# Altium footprint library 总库.PcbLib: 264 footprints (part 7 of 17)
Each footprint in its own frame and in the unit in brackets; x right, y up, seen from the top. Pads: shape width x height; smd on the part's side, far side on the other; paste and mask are expansions set on the pad; w line width, h text height; cw(c..) or ccw(c..) is an arc to the next point about the centre after c.
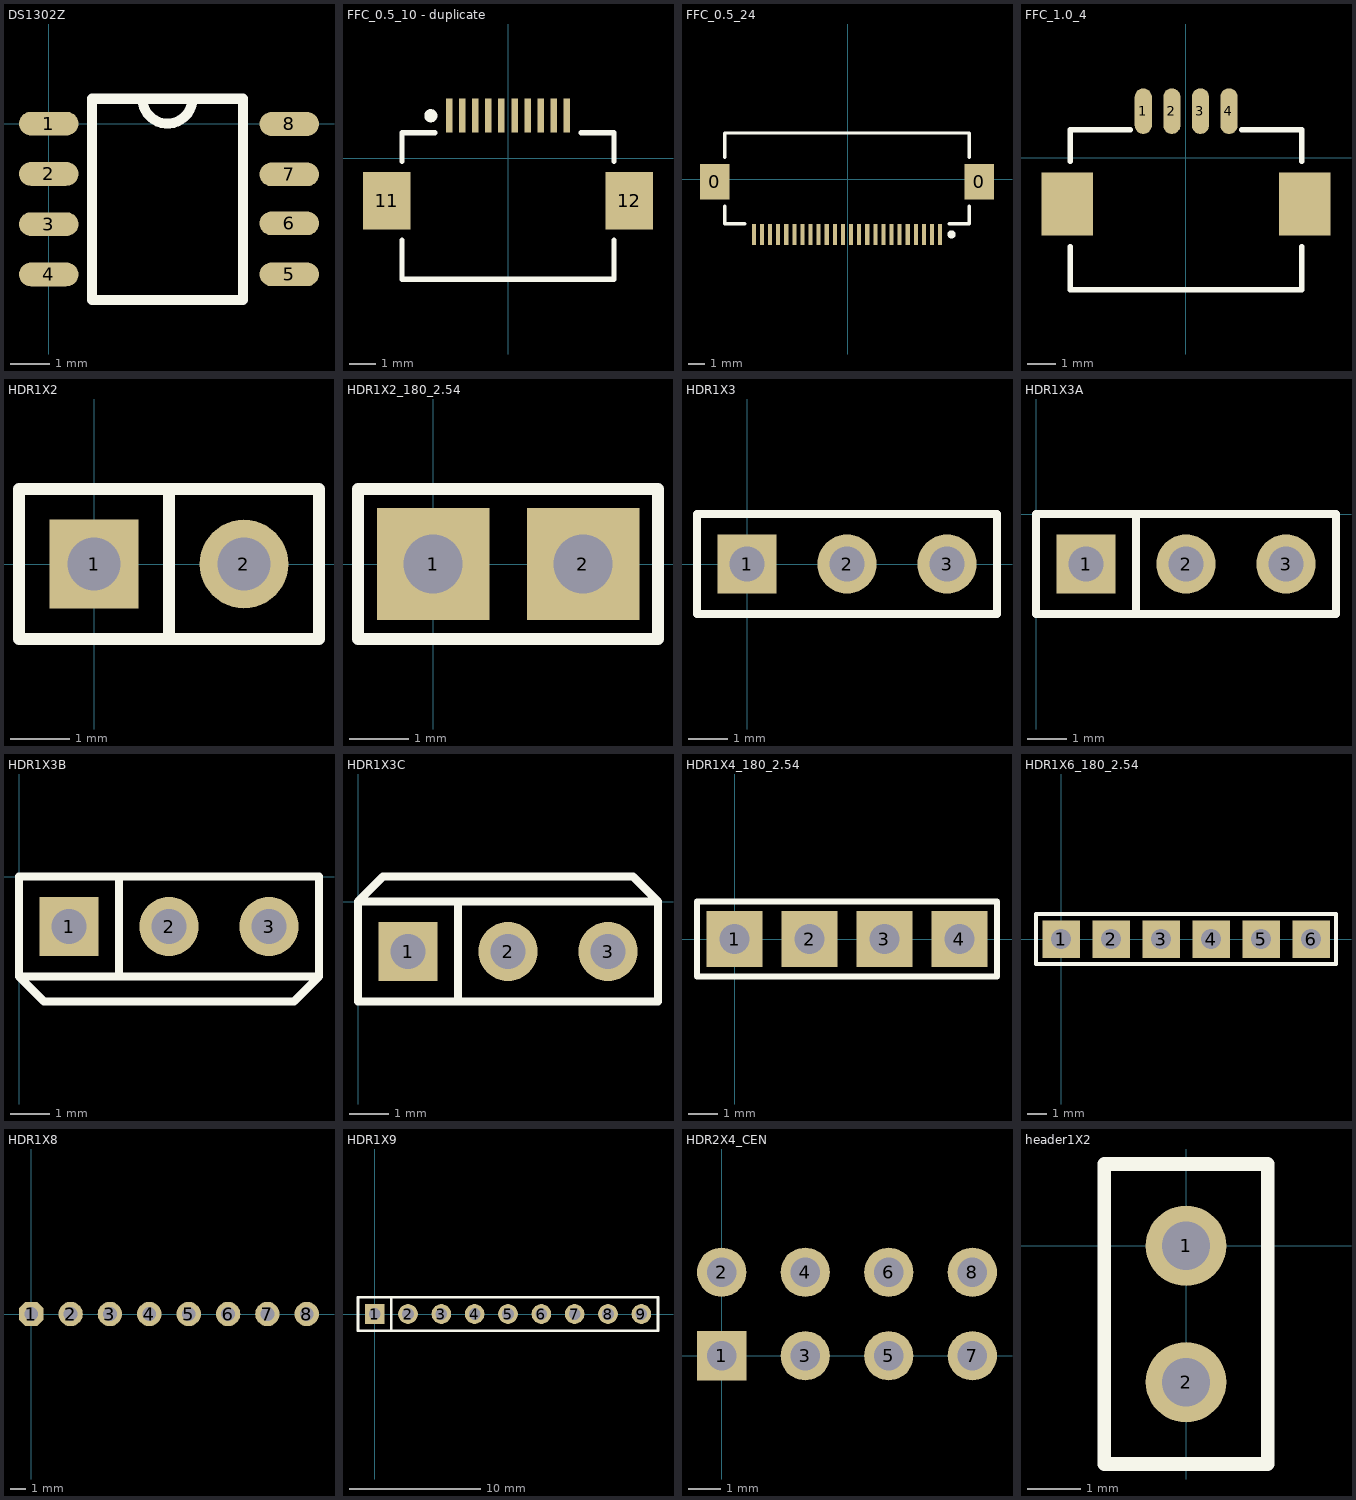
[diagram p6: the footprints below, top view; thin cyan lines are the x and y axes]

## DS1302Z [mm]
pads (8):
  oval 1.5x0.6 smd: 1(0,0) 2(0,-1.27) 3(0,-2.54) 4(0,-3.81) 5(6.08,-3.805) 6(6.08,-2.517) 7(6.08,-1.28) 8(6.08,-0.008)
Top Overlay:
  lines w0.254: 2.37,0.63 ccw(c3,0.63) 3.63,0.63 ; 1.095,-4.45 1.095,0.63 4.905,0.63 4.905,-4.45 1.095,-4.45

## FFC_0.5_10 - duplicate [mm] "Connector; FH12 Series; 10 Position; 0.5mm Spaced Bottom Contact"
height 2
pads (12):
  rect 0.25x1.3 smd: 1(-2.25,1.625) 2(-1.75,1.625) 3(-1.25,1.625) 4(-0.75,1.625) 5(-0.25,1.625) 6(0.25,1.625) 7(0.75,1.625) 8(1.25,1.625) 9(1.75,1.625) 10(2.25,1.625)
  rect 1.8x2.2 smd: 11(-4.633,-1.625) 12(4.633,-1.625)
Top Overlay:
  circle w0.25: c-2.95,1.625 r0.125
  lines w0.2: -4.05,-3.125 -4.05,-4.625 4.05,-4.625 4.05,-3.125 ; -4.05,-0.125 -4.05,0.975 -2.8,0.975 ; 2.8,0.975 4.05,0.975 4.05,-0.125
3D body: height 1.9, standoff 0.03, extent -5.242,-3.683 5.258,1.217

## FFC_0.5_24 [mm]
pads (26):
  rect 1.8x2.2 smd: 0(-8.209,-0.153) 0(8.107,-0.153)
  rect 0.25x1.3 smd: 1(5.699,-3.403) 2(5.199,-3.403) 3(4.699,-3.403) 4(4.199,-3.403) 5(3.699,-3.403) 6(3.199,-3.403) 7(2.699,-3.403) 8(2.199,-3.403) 9(1.699,-3.403) 10(1.199,-3.403) 11(0.699,-3.403) 12(0.199,-3.403) 13(-0.301,-3.403) 14(-0.801,-3.403) 15(-1.301,-3.403) 16(-1.801,-3.403) 17(-2.301,-3.403) 18(-2.801,-3.403) 19(-3.301,-3.403) 20(-3.801,-3.403) 21(-4.301,-3.403) 22(-4.801,-3.403) 23(-5.301,-3.403) 24(-5.801,-3.403)
Top Overlay:
  circle w0.25: c6.399,-3.403 r0.125
  lines w0.2: -7.601,-1.653 -7.601,-2.753 -6.351,-2.753 ; -7.601,1.347 -7.601,2.847 7.499,2.847 7.499,1.347 ; 6.249,-2.753 7.499,-2.753 7.499,-1.653
3D body: height 2.08, standoff -0.03, extent -8.801,-3.185 8.699,2.151

## FFC_1.0_4 [mm] "Connector; FH12 Series; 4 Position; 1.0mm Spaced Bottom Eccentric Contact"
height 2
pads (6):
  oval 0.6x1.6 smd: 1(-1.496,1.625) 2(-0.496,1.625) 3(0.504,1.625) 4(1.504,1.625)
  rect 1.8x2.2 smd: ""(-4.15,-1.625) ""(4.15,-1.625)
Top Overlay:
  lines w0.2: -4.05,-3.125 -4.05,-4.625 4.05,-4.625 4.05,-3.125 ; -4.05,-0.125 -4.05,0.975 -1.95,0.975 ; 1.95,0.975 4.05,0.975 4.05,-0.125
3D body: height 2.7, standoff -0.1, extent -5.488,-4.699 5.512,1.811

## HDR1X2 [mm]
pads (2):
  rect 1.5x1.5 hole 0.9: 1(0,0)
  round 1.5 hole 0.9: 2(2.54,0)
Top Overlay:
  lines w0.2: 1.27,-1.27 1.27,1.27 ; -1.27,-1.27 3.81,-1.27 3.81,1.27 -1.27,1.27 -1.27,-1.27

## HDR1X2_180_2.54 [mm] "Connector; Header; 2 Position"
height 4.3
pads (2):
  rect 1.905x1.905 hole 1: 1(0,0) 2(2.54,0)
Top Overlay:
  lines w0.2: -1.27,-1.27 3.81,-1.27 3.81,1.27 -1.27,1.27 -1.27,-1.27
3D body: height 7.58, standoff -2.94, extent -1.27,-1.27 1.27,1.27
3D body: height 7.58, standoff -2.94, extent 1.27,-1.27 3.81,1.27

## HDR1X3 [mm] "Connector; Header; 3 Position"
pads (3):
  rect 1.5x1.5 hole 0.9: 1(0,0)
  round 1.5 hole 0.9: 2(2.54,0) 3(5.08,0)
Top Overlay:
  lines w0.2: -1.27,-1.27 6.35,-1.27 6.35,1.27 -1.27,1.27 -1.27,-1.27

## HDR1X3A [mm]
pads (3):
  rect 1.5x1.5 hole 0.9: 1(1.27,-1.27)
  round 1.5 hole 0.9: 2(3.81,-1.27) 3(6.35,-1.27)
Top Overlay:
  lines w0.2: 2.54,-2.54 2.54,0 ; 0,-2.54 0,0 7.62,0 7.62,-2.54 0,-2.54

## HDR1X3B [mm]
pads (3):
  rect 1.5x1.5 hole 0.9: 1(1.27,-1.27)
  round 1.5 hole 0.9: 2(3.81,-1.27) 3(6.35,-1.27)
Top Overlay:
  lines w0.2: 2.54,-2.54 2.54,0 ; 0,-2.54 0.635,-3.175 1.27,-3.175 6.35,-3.175 6.985,-3.175 7.62,-2.54 ; 0,-2.54 0,0 7.62,0 7.62,-2.54 ; 0,-2.54 7.62,-2.54

## HDR1X3C [mm]
pads (3):
  rect 1.5x1.5 hole 0.9: 1(1.27,-1.27)
  round 1.5 hole 0.9: 2(3.81,-1.27) 3(6.35,-1.27)
Top Overlay:
  lines w0.2: 2.54,-2.54 2.54,0 ; 0,0 0.635,0.635 6.985,0.635 7.62,0 ; 0,0 0,-2.54 7.62,-2.54 7.62,0 ; 0,0 7.62,0

## HDR1X4_180_2.54 [mm] "Connector; Header; 4 Position"
height 4.3
pads (4):
  rect 1.905x1.905 hole 1: 1(0,0) 2(2.54,0) 3(5.08,0) 4(7.62,0)
Top Overlay:
  lines w0.2: -1.27,-1.27 -1.27,1.27 8.89,1.27 8.89,-1.27 -1.27,-1.27
3D body: height 7.58, standoff -2.94, extent 6.35,-1.27 8.89,1.27
3D body: height 7.58, standoff -2.94, extent 3.81,-1.27 6.35,1.27
3D body: height 7.58, standoff -2.94, extent -1.27,-1.27 1.27,1.27
3D body: height 7.58, standoff -2.94, extent 1.27,-1.27 3.81,1.27

## HDR1X6_180_2.54 [mm] "Connector; Header; 6 Position"
height 4.3
pads (6):
  rect 1.905x1.905 hole 1: 1(0,0) 2(2.54,0) 3(5.08,0) 4(7.62,0) 5(10.16,0) 6(12.7,0)
Top Overlay:
  lines w0.2: -1.27,-1.27 13.97,-1.27 13.97,1.27 -1.27,1.27 -1.27,-1.27
3D body: height 7.58, standoff -2.94, extent 11.43,-1.27 13.97,1.27
3D body: height 7.58, standoff -2.94, extent 8.89,-1.27 11.43,1.27
3D body: height 7.58, standoff -2.94, extent 6.35,-1.27 8.89,1.27
3D body: height 7.58, standoff -2.94, extent 3.81,-1.27 6.35,1.27
3D body: height 7.58, standoff -2.94, extent 1.27,-1.27 3.81,1.27
3D body: height 7.58, standoff -2.94, extent -1.27,-1.27 1.27,1.27

## HDR1X8 [mil]
pads (8):
  oct 62x62 hole 35: 1(0,0)
  round 62 hole 35: 2(100,0) 3(200,0) 4(300,0) 5(400,0) 6(500,0) 7(600,0) 8(700,0)

## HDR1X9 [mm] "Connector; Header; 3 Position"
pads (9):
  rect 1.5x1.5 hole 0.9: 1(0,0)
  round 1.5 hole 0.9: 2(2.54,0) 3(5.08,0) 4(7.62,0) 5(10.16,0) 6(12.7,0) 7(15.24,0) 8(17.78,0) 9(20.32,0)
Top Overlay:
  lines w0.2: 1.27,-1.27 1.27,1.27 ; -1.27,-1.27 -1.27,1.27 21.59,1.27 21.59,-1.27 -1.27,-1.27

## HDR2X4_CEN [mm] "Connector; Header; 4x2 Position"
pads (8):
  rect 1.5x1.5 hole 0.9: 1(0,0)
  round 1.5 hole 0.9: 2(0,2.54) 3(2.54,0) 4(2.54,2.54) 5(5.08,0) 6(5.08,2.54) 7(7.62,0) 8(7.62,2.54)

## header1X2 [mm]
pads (2):
  round 1.5 hole 0.9: 1(0,0) 2(0,-2.54)
Top Overlay:
  lines w0.254: -1.524,-4.064 1.524,-4.064 1.524,1.524 -1.524,1.524 -1.524,-4.064
3D body: height 9.4, standoff -3, extent -1.248,-3.886 1.248,1.194